# Altium footprint library ChipResistors-0805-E24.PcbLib: 37 footprints (part 2 of 3)
Each footprint in its own frame and in the unit in brackets; x right, y up, seen from the top. Pads: shape width x height; smd on the part's side, far side on the other; paste and mask are expansions set on the pad; w line width, h text height; cw(c..) or ccw(c..) is an arc to the next point about the centre after c.
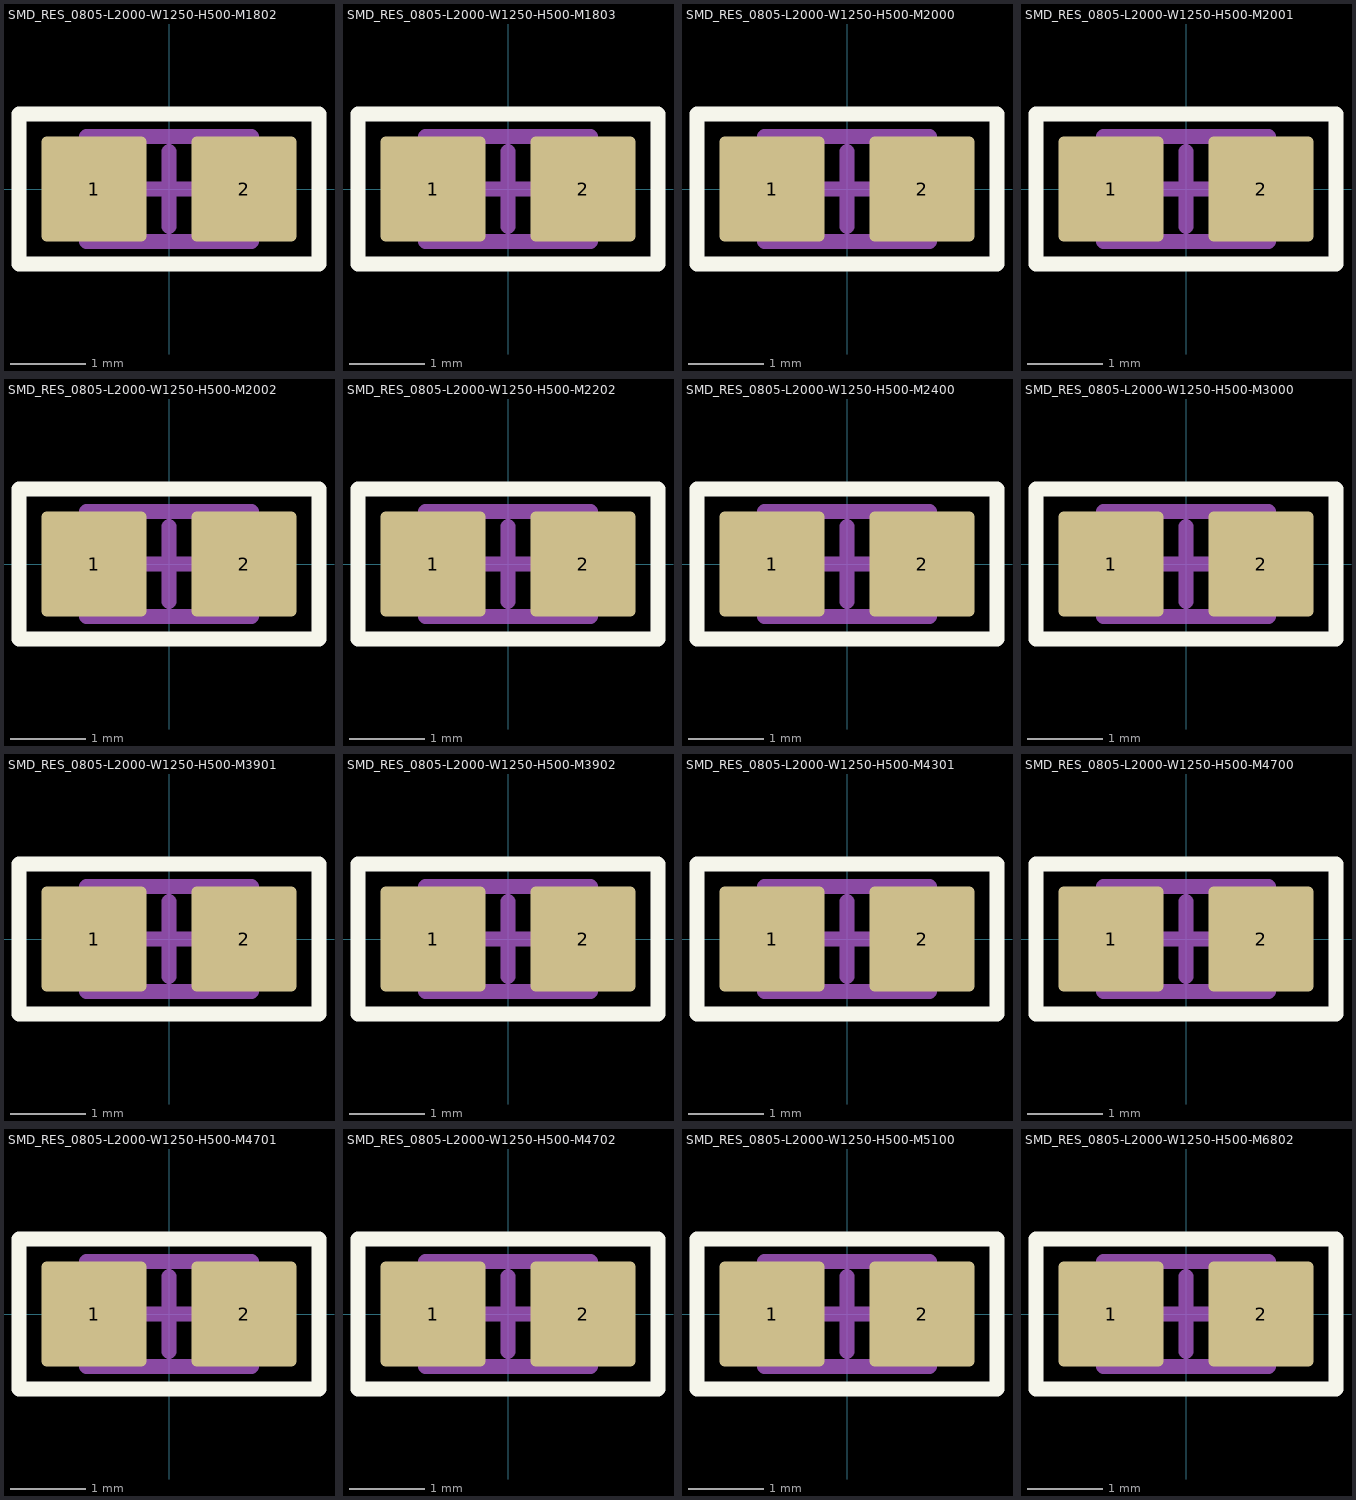
[diagram p1: the footprints below, top view; thin cyan lines are the x and y axes]

## SMD_RES_0805-L2000-W1250-H500-M1802 [mm] "Chip Resistor, 2-Leads, Body 2.000x1.250x0.500mm, IPC Medium Density"
height 0.5
pads (2):
  rrect10% 1.4x1.4 smd: 1(-1,0) 2(1,0)
Top Overlay:
  lines w0.2: -2,-1 2,-1 2,1 -2,1 -2,-1
Top Courtyard:
  lines w0.1: -2,-1 -2,1 2,1 2,-1 -2,-1
  lines w0.2: -0.5,0 0.5,0 ; 0,-0.5 0,0.5
Top Assembly:
  lines w0.2: -1.1,-0.7 1.1,-0.7 1.1,0.7 -1.1,0.7 -1.1,-0.7
3D body "CR0805-1802.STEP": height 0.5, standoff 0, extent -1,-0.625 1,0.625

## SMD_RES_0805-L2000-W1250-H500-M1803 [mm] "Chip Resistor, 2-Leads, Body 2.000x1.250x0.500mm, IPC Medium Density"
height 0.5
pads (2):
  rrect10% 1.4x1.4 smd: 1(-1,0) 2(1,0)
Top Overlay:
  lines w0.2: -2,-1 -2,1 2,1 2,-1 -2,-1
Top Courtyard:
  lines w0.1: -2,-1 2,-1 2,1 -2,1 -2,-1
  lines w0.2: -0.5,0 0.5,0 ; 0,-0.5 0,0.5
Top Assembly:
  lines w0.2: -1.1,-0.7 -1.1,0.7 1.1,0.7 1.1,-0.7 -1.1,-0.7
3D body "CR0805-1803.STEP": height 0.5, standoff 0, extent -1,-0.625 1,0.625

## SMD_RES_0805-L2000-W1250-H500-M2000 [mm] "Chip Resistor, 2-Leads, Body 2.000x1.250x0.500mm, IPC Medium Density"
height 0.5
pads (2):
  rrect10% 1.4x1.4 smd: 1(-1,0) 2(1,0)
Top Overlay:
  lines w0.2: -2,-1 -2,1 2,1 2,-1 -2,-1
Top Courtyard:
  lines w0.1: -2,-1 2,-1 2,1 -2,1 -2,-1
  lines w0.2: -0.5,0 0.5,0 ; 0,-0.5 0,0.5
Top Assembly:
  lines w0.2: -1.1,-0.7 -1.1,0.7 1.1,0.7 1.1,-0.7 -1.1,-0.7
3D body "CR0805-2000.STEP": height 0.5, standoff 0, extent -1,-0.625 1,0.625

## SMD_RES_0805-L2000-W1250-H500-M2001 [mm] "Chip Resistor, 2-Leads, Body 2.000x1.250x0.500mm, IPC Medium Density"
height 0.5
pads (2):
  rrect10% 1.4x1.4 smd: 1(-1,0) 2(1,0)
Top Overlay:
  lines w0.2: -2,-1 2,-1 2,1 -2,1 -2,-1
Top Courtyard:
  lines w0.1: -2,-1 -2,1 2,1 2,-1 -2,-1
  lines w0.2: -0.5,0 0.5,0 ; 0,-0.5 0,0.5
Top Assembly:
  lines w0.2: -1.1,-0.7 1.1,-0.7 1.1,0.7 -1.1,0.7 -1.1,-0.7
3D body "CR0805-2001.STEP": height 0.5, standoff 0, extent -1,-0.625 1,0.625

## SMD_RES_0805-L2000-W1250-H500-M2002 [mm] "Chip Resistor, 2-Leads, Body 2.000x1.250x0.500mm, IPC Medium Density"
height 0.5
pads (2):
  rrect10% 1.4x1.4 smd: 1(-1,0) 2(1,0)
Top Overlay:
  lines w0.2: -2,-1 2,-1 2,1 -2,1 -2,-1
Top Courtyard:
  lines w0.1: -2,-1 -2,1 2,1 2,-1 -2,-1
  lines w0.2: -0.5,0 0.5,0 ; 0,-0.5 0,0.5
Top Assembly:
  lines w0.2: -1.1,-0.7 1.1,-0.7 1.1,0.7 -1.1,0.7 -1.1,-0.7
3D body "CR0805-2002.STEP": height 0.5, standoff 0, extent -1,-0.625 1,0.625

## SMD_RES_0805-L2000-W1250-H500-M2202 [mm] "Chip Resistor, 2-Leads, Body 2.000x1.250x0.500mm, IPC Medium Density"
height 0.5
pads (2):
  rrect10% 1.4x1.4 smd: 1(-1,0) 2(1,0)
Top Overlay:
  lines w0.2: -2,-1 -2,1 2,1 2,-1 -2,-1
Top Courtyard:
  lines w0.1: -2,-1 2,-1 2,1 -2,1 -2,-1
  lines w0.2: -0.5,0 0.5,0 ; 0,-0.5 0,0.5
Top Assembly:
  lines w0.2: -1.1,-0.7 -1.1,0.7 1.1,0.7 1.1,-0.7 -1.1,-0.7
3D body "CR0805-2202.STEP": height 0.5, standoff 0, extent -1,-0.625 1,0.625

## SMD_RES_0805-L2000-W1250-H500-M2400 [mm] "Chip Resistor, 2-Leads, Body 2.000x1.250x0.500mm, IPC Medium Density"
height 0.5
pads (2):
  rrect10% 1.4x1.4 smd: 1(-1,0) 2(1,0)
Top Overlay:
  lines w0.2: -2,-1 -2,1 2,1 2,-1 -2,-1
Top Courtyard:
  lines w0.1: -2,-1 2,-1 2,1 -2,1 -2,-1
  lines w0.2: -0.5,0 0.5,0 ; 0,-0.5 0,0.5
Top Assembly:
  lines w0.2: -1.1,-0.7 -1.1,0.7 1.1,0.7 1.1,-0.7 -1.1,-0.7
3D body "CR0805-2400.STEP": height 0.5, standoff 0, extent -1,-0.625 1,0.625

## SMD_RES_0805-L2000-W1250-H500-M3000 [mm] "Chip Resistor, 2-Leads, Body 2.000x1.250x0.500mm, IPC Medium Density"
height 0.5
pads (2):
  rrect10% 1.4x1.4 smd: 1(-1,0) 2(1,0)
Top Overlay:
  lines w0.2: -2,-1 2,-1 2,1 -2,1 -2,-1
Top Courtyard:
  lines w0.1: -2,-1 -2,1 2,1 2,-1 -2,-1
  lines w0.2: -0.5,0 0.5,0 ; 0,-0.5 0,0.5
Top Assembly:
  lines w0.2: -1.1,-0.7 1.1,-0.7 1.1,0.7 -1.1,0.7 -1.1,-0.7
3D body "CR0805-3000.STEP": height 0.5, standoff 0, extent -1,-0.625 1,0.625

## SMD_RES_0805-L2000-W1250-H500-M3901 [mm] "Chip Resistor, 2-Leads, Body 2.000x1.250x0.500mm, IPC Medium Density"
height 0.5
pads (2):
  rrect10% 1.4x1.4 smd: 1(-1,0) 2(1,0)
Top Overlay:
  lines w0.2: -2,-1 -2,1 2,1 2,-1 -2,-1
Top Courtyard:
  lines w0.1: -2,-1 2,-1 2,1 -2,1 -2,-1
  lines w0.2: -0.5,0 0.5,0 ; 0,-0.5 0,0.5
Top Assembly:
  lines w0.2: -1.1,-0.7 -1.1,0.7 1.1,0.7 1.1,-0.7 -1.1,-0.7
3D body "CR0805-3901.STEP": height 0.5, standoff 0, extent -1,-0.625 1,0.625

## SMD_RES_0805-L2000-W1250-H500-M3902 [mm] "Chip Resistor, 2-Leads, Body 2.000x1.250x0.500mm, IPC Medium Density"
height 0.5
pads (2):
  rrect10% 1.4x1.4 smd: 1(-1,0) 2(1,0)
Top Overlay:
  lines w0.2: -2,-1 2,-1 2,1 -2,1 -2,-1
Top Courtyard:
  lines w0.1: -2,-1 -2,1 2,1 2,-1 -2,-1
  lines w0.2: -0.5,0 0.5,0 ; 0,-0.5 0,0.5
Top Assembly:
  lines w0.2: -1.1,-0.7 1.1,-0.7 1.1,0.7 -1.1,0.7 -1.1,-0.7
3D body "CR0805-3902.STEP": height 0.5, standoff 0, extent -1,-0.625 1,0.625

## SMD_RES_0805-L2000-W1250-H500-M4301 [mm] "Chip Resistor, 2-Leads, Body 2.000x1.250x0.500mm, IPC Medium Density"
height 0.5
pads (2):
  rrect10% 1.4x1.4 smd: 1(-1,0) 2(1,0)
Top Overlay:
  lines w0.2: -2,-1 -2,1 2,1 2,-1 -2,-1
Top Courtyard:
  lines w0.1: -2,-1 2,-1 2,1 -2,1 -2,-1
  lines w0.2: -0.5,0 0.5,0 ; 0,-0.5 0,0.5
Top Assembly:
  lines w0.2: -1.1,-0.7 -1.1,0.7 1.1,0.7 1.1,-0.7 -1.1,-0.7
3D body "CR0805-4301.STEP": height 0.5, standoff 0, extent -1,-0.625 1,0.625

## SMD_RES_0805-L2000-W1250-H500-M4700 [mm] "Chip Resistor, 2-Leads, Body 2.000x1.250x0.500mm, IPC Medium Density"
height 0.5
pads (2):
  rrect10% 1.4x1.4 smd: 1(-1,0) 2(1,0)
Top Overlay:
  lines w0.2: -2,-1 2,-1 2,1 -2,1 -2,-1
Top Courtyard:
  lines w0.1: -2,-1 -2,1 2,1 2,-1 -2,-1
  lines w0.2: -0.5,0 0.5,0 ; 0,-0.5 0,0.5
Top Assembly:
  lines w0.2: -1.1,-0.7 1.1,-0.7 1.1,0.7 -1.1,0.7 -1.1,-0.7
3D body "CR0805-4700.STEP": height 0.5, standoff 0, extent -1,-0.625 1,0.625

## SMD_RES_0805-L2000-W1250-H500-M4701 [mm] "Chip Resistor, 2-Leads, Body 2.000x1.250x0.500mm, IPC Medium Density"
height 0.5
pads (2):
  rrect10% 1.4x1.4 smd: 1(-1,0) 2(1,0)
Top Overlay:
  lines w0.2: -2,-1 2,-1 2,1 -2,1 -2,-1
Top Courtyard:
  lines w0.1: -2,-1 -2,1 2,1 2,-1 -2,-1
  lines w0.2: -0.5,0 0.5,0 ; 0,-0.5 0,0.5
Top Assembly:
  lines w0.2: -1.1,-0.7 1.1,-0.7 1.1,0.7 -1.1,0.7 -1.1,-0.7
3D body "CR0805-4701.STEP": height 0.5, standoff 0, extent -1,-0.625 1,0.625

## SMD_RES_0805-L2000-W1250-H500-M4702 [mm] "Chip Resistor, 2-Leads, Body 2.000x1.250x0.500mm, IPC Medium Density"
height 0.5
pads (2):
  rrect10% 1.4x1.4 smd: 1(-1,0) 2(1,0)
Top Overlay:
  lines w0.2: -2,-1 2,-1 2,1 -2,1 -2,-1
Top Courtyard:
  lines w0.1: -2,-1 -2,1 2,1 2,-1 -2,-1
  lines w0.2: -0.5,0 0.5,0 ; 0,-0.5 0,0.5
Top Assembly:
  lines w0.2: -1.1,-0.7 1.1,-0.7 1.1,0.7 -1.1,0.7 -1.1,-0.7
3D body "CR0805-4702.STEP": height 0.5, standoff 0, extent -1,-0.625 1,0.625

## SMD_RES_0805-L2000-W1250-H500-M5100 [mm] "Chip Resistor, 2-Leads, Body 2.000x1.250x0.500mm, IPC Medium Density"
height 0.5
pads (2):
  rrect10% 1.4x1.4 smd: 1(-1,0) 2(1,0)
Top Overlay:
  lines w0.2: -2,-1 -2,1 2,1 2,-1 -2,-1
Top Courtyard:
  lines w0.1: -2,-1 2,-1 2,1 -2,1 -2,-1
  lines w0.2: -0.5,0 0.5,0 ; 0,-0.5 0,0.5
Top Assembly:
  lines w0.2: -1.1,-0.7 -1.1,0.7 1.1,0.7 1.1,-0.7 -1.1,-0.7
3D body "CR0805-5100.STEP": height 0.5, standoff 0, extent -1,-0.625 1,0.625

## SMD_RES_0805-L2000-W1250-H500-M6802 [mm] "Chip Resistor, 2-Leads, Body 2.000x1.250x0.500mm, IPC Medium Density"
height 0.5
pads (2):
  rrect10% 1.4x1.4 smd: 1(-1,0) 2(1,0)
Top Overlay:
  lines w0.2: -2,-1 -2,1 2,1 2,-1 -2,-1
Top Courtyard:
  lines w0.1: -2,-1 2,-1 2,1 -2,1 -2,-1
  lines w0.2: -0.5,0 0.5,0 ; 0,-0.5 0,0.5
Top Assembly:
  lines w0.2: -1.1,-0.7 -1.1,0.7 1.1,0.7 1.1,-0.7 -1.1,-0.7
3D body "CR0805-6802.STEP": height 0.5, standoff 0, extent -1,-0.625 1,0.625